# Altium footprint library SWARMUS_LIB.PcbLib: 114 footprints (part 7 of 8)
Each footprint in its own frame and in the unit in brackets; x right, y up, seen from the top. Pads: shape width x height; smd on the part's side, far side on the other; paste and mask are expansions set on the pad; w line width, h text height; cw(c..) or ccw(c..) is an arc to the next point about the centre after c.
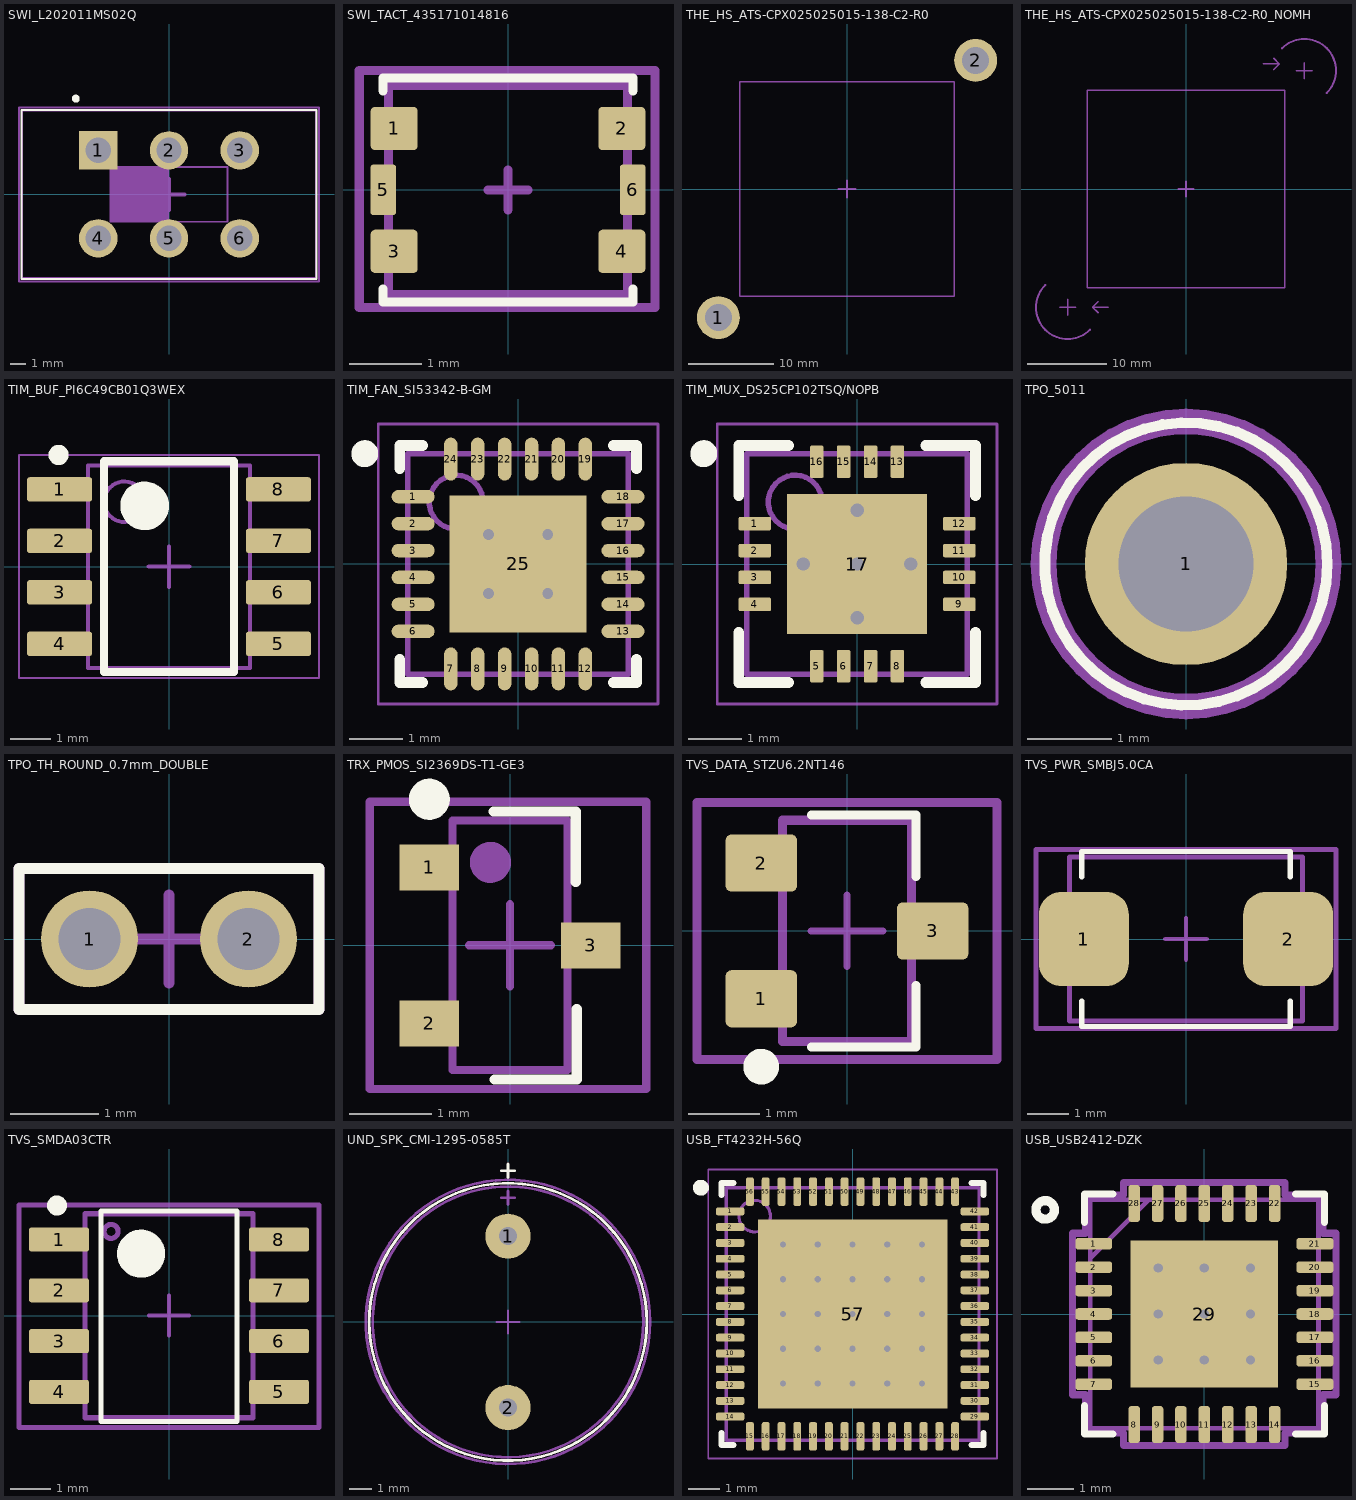
[diagram p6: the footprints below, top view; thin cyan lines are the x and y axes]

## SWI_L202011MS02Q [mm]
pads (6):
  rect 2.5x2.5 hole 1.65: 1(-4.6,2.86)
  round 2.5 hole 1.65: 2(0,2.86) 3(4.6,2.86) 4(-4.6,-2.86) 5(0,-2.86) 6(4.6,-2.86)
Top Overlay:
  circle w0.254: c-6.059,6.224 r0.127
  lines w0.127: -9.6,-5.5 -9.6,5.5 9.6,5.5 9.6,-5.5 -9.6,-5.5
Top Assembly Drawing:
  circle w0.127: c-5.486,-2.667 r0.265
  rectangle: -3.81,-1.778 0,1.778
  lines w0.127: -9.563,-5.448 -9.563,5.448 9.563,5.448 9.563,-5.448 -9.563,-5.448 ; -3.81,-1.778 -3.81,1.778 3.81,1.778 3.81,-1.778 -3.81,-1.778
Top Courtyard:
  lines w0.127: -9.75,-5.65 -9.75,5.65 9.75,5.65 9.75,-5.65 -9.75,-5.65
  lines w0.254: -1.016,0 1.016,0 ; 0,-1.016 0,1.016
3D body "L202011MS02Q.step": height 14.66, standoff -4.09, extent -9.563,-5.448 9.563,5.448

## SWI_TACT_435171014816 [mm]
pads (6):
  rrect20% 0.65x0.6 smd paste+0 mask+0.05: 1(-1.575,0.85) 2(1.575,0.85) 3(-1.575,-0.85) 4(1.575,-0.85)
  rrect20% 0.35x0.7 smd paste+0 mask+0.05: 5(-1.725,0) 6(1.725,0)
Top Overlay:
  lines w0.127: -1.727,-1.372 -1.727,-1.549 1.727,-1.549 1.727,-1.372 ; -1.727,1.372 -1.727,1.549 1.727,1.549 1.727,1.372
Top Assembly Drawing:
  lines w0.127: -1.651,-1.45 -1.651,1.45 ; -1.651,-1.448 1.65,-1.448 ; -1.651,1.448 1.649,1.448 ; 1.651,-1.45 1.651,1.45
Top Courtyard:
  lines w0.127: -0.275,0 0.275,0 ; 0,-0.275 0,0.275 ; -2.057,-1.626 2.032,-1.626 2.032,1.651 -2.057,1.651 -2.057,-1.626
3D body "WS-TASV SMT Tact Switch v4.step": height 1.4, standoff 0, extent -1.65,-1.45 1.65,1.45

## THE_HS_ATS-CPX025025015-138-C2-R0 [mm] "25x25x15mm Heatsink"
pads (2):
  round 5 hole 3.175 paste-7.62 mask+0.07: 1(-15,-15) 2(15,15)
Top Assembly Drawing:
  lines w0.2: -1,0 1,0 ; 0,-1 0,1 ; -12.5,-12.5 -12.5,12.5 12.5,12.5 12.5,-12.5 -12.5,-12.5
3D body "ATS-CPX-138-CX-R0_FUSED.STEP": height 15, standoff 0, extent -18.994,-18.994 18.994,18.994

## THE_HS_ATS-CPX025025015-138-C2-R0_NOMH [mm] "25x25x15mm Heatsink"
Top Assembly Drawing:
  lines w0.2: -16,-15 -14,-15 ; -15,-16 -15,-14 ; -11.127,-15.669 -11.834,-14.962 ; -11.127,-14.255 -11.834,-14.962 ; -9.834,-14.962 -11.834,-14.962 ; -1,0 1,0 ; 0,-1 0,1 ; 9.806,15.847 11.806,15.847 ; 11.099,15.14 11.806,15.847 ; 11.099,16.554 11.806,15.847 ; 14,15 16,15 ; 15,14 15,16 ; -12.5,-12.5 -12.5,12.5 12.5,12.5 12.5,-12.5 -12.5,-12.5
  lines w0.254: -17.828,-12.172 ccw(c-15,-15) -12.172,-17.828 ; 12.172,17.828 cw(c15,15) 17.828,12.172
  text "Grounded M3 Mounting hole" at -9.402,-16.935 h1
  text "Grounded M3 Mounting hole" at -3.563,13.741 h1
3D body "ATS-CPX-138-CX-R0_FUSED.STEP": height 16, standoff 1, extent -18.995,-18.994 18.994,18.995

## TIM_BUF_PI6C49CB01Q3WEX [mm] "SOIC-8"
height 1.75
pads (8):
  rrect20% 1.6x0.6 smd paste-0.025 mask+0.07: 1(-2.7,1.905) 2(-2.7,0.635) 3(-2.7,-0.635) 4(-2.7,-1.905) 5(2.7,-1.905) 6(2.7,-0.635) 7(2.7,0.635) 8(2.7,1.905)
Top Overlay:
  circle w0.25: c-2.725,2.755 r0.125
  circle w0.6: c-0.6,1.5 r0.3
  lines w0.2: -1.6,-2.6 1.6,-2.6 1.6,2.6 -1.6,2.6 -1.6,-2.6
Top Assembly Drawing:
  circle w0.1: c-1.1,1.6 r0.5
  lines w0.1: -2,-2.5 -2,2.5 2,2.5 2,-2.5 -2,-2.5
Top Courtyard:
  lines w0.05: -3.7,-2.75 -3.7,2.75 3.7,2.75 3.7,-2.75 -3.7,-2.75
  lines w0.1: -0.5,0 0.5,0 ; 0,-0.5 0,0.5
3D body "SOIC127P600X175-8N.step": height 1.75, standoff 0, extent -3,-2.5 3,2.5

## TIM_FAN_SI53342-B-GM [mm] "QFN24"
height 0.9
pads (25):
  oval 0.8x0.25 smd paste+0 mask+0.07: 1(-1.95,1.25) 2(-1.95,0.75) 3(-1.95,0.25) 4(-1.95,-0.25) 5(-1.95,-0.75) 6(-1.95,-1.25) 13(1.95,-1.25) 14(1.95,-0.75) 15(1.95,-0.25) 16(1.95,0.25) 17(1.95,0.75) 18(1.95,1.25)
  oval 0.25x0.8 smd paste+0 mask+0.07: 7(-1.25,-1.95) 8(-0.75,-1.95) 9(-0.25,-1.95) 10(0.25,-1.95) 11(0.75,-1.95) 12(1.25,-1.95) 19(1.25,1.95) 20(0.75,1.95) 21(0.25,1.95) 22(-0.25,1.95) 23(-0.75,1.95) 24(-1.25,1.95)
  rect 2.55x2.55 smd paste-2.55 mask+0.05: 25(0,0)
via 0.55,-0.55 diameter 0.5 hole 0.2
via -0.55,-0.55 diameter 0.5 hole 0.2
via 0.55,0.55 diameter 0.5 hole 0.2
via -0.55,0.55 diameter 0.5 hole 0.2
Top Overlay:
  circle w0.25: c-2.85,2.05 r0.125
  lines w0.2: -2.2,-1.775 -2.2,-2.2 -1.775,-2.2 ; -2.2,1.775 -2.2,2.2 -1.775,2.2 ; 1.775,-2.2 2.2,-2.2 2.2,-1.775 ; 1.775,2.2 2.2,2.2 2.2,1.775
Top Paste:
  rectangle: -1.25,0.15 -0.15,1.25
  rectangle: -1.25,-1.25 -0.15,-0.15
  rectangle: 0.15,-1.25 1.25,-0.15
  rectangle: 0.15,0.15 1.25,1.25
Top Assembly Drawing:
  circle w0.1: c-1.15,1.15 r0.5
  lines w0.1: -2.05,-2.05 2.05,-2.05 2.05,2.05 -2.05,2.05 -2.05,-2.05
Top Courtyard:
  lines w0.05: -2.6,-2.6 2.6,-2.6 2.6,2.6 -2.6,2.6 -2.6,-2.6
  lines w0.1: -0.5,0 0.5,0 ; 0,-0.5 0,0.5
3D body "QFN50P400X400X90_HS-25N.step": height 0.9, standoff 0, extent -2.051,-2.051 2.051,2.051

## TIM_MUX_DS25CP102TSQ/NOPB [mm] "WQFN-16"
height 0.8
pads (17):
  rrect20% 0.6x0.25 smd paste+0 mask+0.07: 1(-1.9,0.75) 2(-1.9,0.25) 3(-1.9,-0.25) 4(-1.9,-0.75) 9(1.9,-0.75) 10(1.9,-0.25) 11(1.9,0.25) 12(1.9,0.75)
  rrect20% 0.25x0.6 smd paste+0 mask+0.07: 5(-0.75,-1.9) 6(-0.25,-1.9) 7(0.25,-1.9) 8(0.75,-1.9) 13(0.75,1.9) 14(0.25,1.9) 15(-0.25,1.9) 16(-0.75,1.9)
  rect 2.6x2.6 smd paste-1.3 mask+0.07: 17(0,0)
via 0,0 diameter 0.5 hole 0.25
via -1,0 diameter 0.5 hole 0.25
via 0,1 diameter 0.5 hole 0.25
via 0,-1 diameter 0.5 hole 0.25
via 1,0 diameter 0.5 hole 0.25
Top Overlay:
  circle w0.25: c-2.85,2.05 r0.125
  lines w0.2: -2.2,-1.275 -2.2,-2.2 -1.275,-2.2 ; -2.2,1.275 -2.2,2.2 -1.275,2.2 ; 1.275,-2.2 2.2,-2.2 2.2,-1.275 ; 1.275,2.2 2.2,2.2 2.2,1.275
Top Paste:
  rectangle: 0.1,0.1 1.25,1.25
  rectangle: 0.1,-1.25 1.25,-0.1
  rectangle: -1.25,-1.25 -0.1,-0.1
  rectangle: -1.25,0.1 -0.1,1.25
Top Assembly Drawing:
  circle w0.1: c-1.15,1.15 r0.5
  lines w0.1: -2.05,-2.05 -2.05,2.05 2.05,2.05 2.05,-2.05 -2.05,-2.05
Top Courtyard:
  lines w0.05: -2.6,-2.6 -2.6,2.6 2.6,2.6 2.6,-2.6 -2.6,-2.6
  lines w0.1: -0.5,0 0.5,0 ; 0,-0.5 0,0.5
3D body "QFN50P400X400X80_HS-17N.step": height 0.8, standoff 0, extent -2.051,-2.051 2.051,2.051

## TPO_5011 [mm]
pads (1):
  round 2.4 hole 1.6: 1(0,0)
Top Overlay:
  circle w0.127: c0,0 r1.676
Top Assembly Drawing:
  circle w0.127: c0,0 r1.6
Top Courtyard:
  circle w0.127: c0,0 r1.779
3D body "keystone-PN5011.STEP": height 8.13, standoff -3.17, extent -1.587,-1.587 1.588,1.588

## TPO_TH_ROUND_0.7mm_DOUBLE [mm] "Double via TP"
pads (2):
  round 1.1 hole 0.7 mask+0.07: 1(-0.9,0) 2(0.9,0)
Top Overlay:
  lines w0.127: -1.7,-0.8 1.7,-0.8 1.7,0.8 -1.7,0.8 -1.7,-0.8
Top Courtyard:
  lines w0.127: -0.5,0 0.5,0 ; 0,-0.5 0,0.5 ; -1.7,-0.8 -1.7,0.8 1.7,0.8 1.7,-0.8 -1.7,-0.8

## TRX_PMOS_SI2369DS-T1-GE3 [mm]
height 1.12
pads (3):
  rect 0.724x0.559 smd paste-0.025 mask+0.07: 1(-0.984,0.95) 2(-0.984,-0.95) 3(0.984,0)
Top Overlay:
  circle w0.25: c-0.984,1.78 r0.125
  lines w0.127: -0.2,1.63 0.8,1.63 0.8,0.773 ; -0.188,-1.635 0.812,-1.635 0.812,-0.778
Top Assembly Drawing:
  circle w0.25: c-0.24,1.011 r0.125
  lines w0.1: -0.7,-1.52 -0.7,1.52 0.7,1.52 0.7,-1.52 -0.7,-1.52
Top Courtyard:
  lines w0.1: -0.5,0 0.5,0 ; 0,-0.5 0,0.5 ; -1.709,-1.75 -1.709,1.75 1.658,1.75 1.658,-1.75 -1.709,-1.75
3D body "SOT95P237X112-3N.step": height 1.12, standoff 0, extent -1.32,-1.52 1.32,1.52

## TVS_DATA_STZU6.2NT146 [mm] "SOT23, 3-Leads, Body 2.90x2.80mm, Pitch 0.95mm, IPC Medium Density"
height 1.3
pads (3):
  rrect20% 1x0.8 smd paste-0.05 mask+0.07: 1(-1.2,-0.95) 2(-1.2,0.95) 3(1.2,0)
Top Overlay:
  circle w0.25: c-1.2,-1.9 r0.125
  lines w0.127: -0.5,-1.625 0.968,-1.625 0.968,-0.764 ; -0.5,1.625 0.968,1.625 0.968,0.764
Top Assembly Drawing:
  lines w0.127: -0.9,-1.55 0.9,-1.55 0.9,1.55 -0.9,1.55 -0.9,-1.55
Top Courtyard:
  lines w0.1: -0.5,0 0.5,0 ; 0,-0.5 0,0.5
  lines w0.127: -2.1,-1.8 -2.1,1.8 2.1,1.8 2.1,-1.8 -2.1,-1.8
3D body "SOT95P280X130-3N.step": height 1.3, standoff 0, extent -1.5,-1.55 1.5,1.55

## TVS_PWR_SMBJ5.0CA [mm] "Molded Diode, 2-Leads, Body 4,40x3,62mm, IPC Medium Density"
height 2.61
pads (2):
  rrect50% 2.16x2.26 smd paste-0.025 mask+0.07: 1(-2.45,0) 2(2.45,0)
Top Overlay:
  lines w0.127: -2.5,-1.493 -2.5,-2.1 2.5,-2.1 2.5,-1.493 ; -2.5,1.493 -2.5,2.1 2.5,2.1 2.5,1.493
Top Assembly Drawing:
  lines w0.127: -2.795,-1.97 2.795,-1.97 2.795,1.97 -2.795,1.97 -2.795,-1.97
Top Courtyard:
  lines w0.1: -0.5,0 0.5,0 ; 0,-0.5 0,0.5
  lines w0.127: -3.6,-2.15 3.6,-2.15 3.6,2.15 -3.6,2.15 -3.6,-2.15
3D body "DIOM4436X26N.step": height 2.61, standoff 0, extent -2.595,-1.97 2.595,1.97

## TVS_SMDA03CTR [mm] "TVS - TVS DIODE 3.3V 7V - 8-SOIC"
height 1.8
pads (8):
  rrect20% 1.5x0.6 smd paste-0.025 mask+0.07: 1(-2.75,1.905) 2(-2.75,0.635) 3(-2.75,-0.635) 4(-2.75,-1.905) 5(2.75,-1.905) 6(2.75,-0.635) 7(2.75,0.635) 8(2.75,1.905)
Top Overlay:
  circle w0.25: c-2.8,2.755 r0.125
  circle w0.6: c-0.7,1.55 r0.3
  lines w0.127: -1.7,-2.642 1.7,-2.642 1.7,2.616 -1.7,2.616 -1.7,-2.642
Top Assembly Drawing:
  lines w0.127: -1.541,1.96 cw(c-1.448,2.108) -1.539,1.959 ; -2.1,-2.55 2.1,-2.55 2.1,2.55 -2.1,2.55 -2.1,-2.55
Top Courtyard:
  lines w0.1: -0.5,0 0.5,0 ; 0,-0.5 0,0.5
  lines w0.127: -3.75,-2.794 -3.75,2.769 3.75,2.769 3.75,-2.794 -3.75,-2.794
3D body "AMP_INSTR_AD623ARZ-RL.step": height 1.75, standoff 0, extent -3,-2.5 3,2.5

## UND_SPK_CMI-1295-0585T [mm]
pads (2):
  round 2 hole 0.8: 1(0,3.8) 2(0,-3.8)
Top Overlay:
  circle w0.127: c0,0 r6.15
  lines w0.127: -0.3,6.7 0.3,6.7 ; 0,6.4 0,7
Top Assembly Drawing:
  circle w0.127: c0,0 r6
  lines w0.127: -0.3,5.505 0.3,5.505 ; 0,5.205 0,5.805
Top Courtyard:
  circle w0.127: c0,0 r6.3
  lines w0.1: -0.5,0 0.5,0 ; 0,-0.5 0,0.5
3D body "CUI_DEVICES_CMI-1295-0585T.step": height 9.6, standoff -5.4, extent -6,-6 6,6

## USB_FT4232H-56Q [mm] "VQFN 56 pin"
height 0.9
pads (57):
  rrect50% 0.9x0.25 smd paste-0.05 mask+0.05: 1(-3.875,3.25) 2(-3.875,2.75) 3(-3.875,2.25) 4(-3.875,1.75) 5(-3.875,1.25) 6(-3.875,0.75) 7(-3.875,0.25) 8(-3.875,-0.25) 9(-3.875,-0.75) 10(-3.875,-1.25) 11(-3.875,-1.75) 12(-3.875,-2.25) 13(-3.875,-2.75) 14(-3.875,-3.25) 29(3.875,-3.25) 30(3.875,-2.75) 31(3.875,-2.25) 32(3.875,-1.75) 33(3.875,-1.25) 34(3.875,-0.75) 35(3.875,-0.25) 36(3.875,0.25) 37(3.875,0.75) 38(3.875,1.25) 39(3.875,1.75) 40(3.875,2.25) 41(3.875,2.75) 42(3.875,3.25)
  rrect50% 0.25x0.9 smd paste-0.05 mask+0.05: 15(-3.25,-3.875) 16(-2.75,-3.875) 17(-2.25,-3.875) 18(-1.75,-3.875) 19(-1.25,-3.875) 20(-0.75,-3.875) 21(-0.25,-3.875) 22(0.25,-3.875) 23(0.75,-3.875) 24(1.25,-3.875) 25(1.75,-3.875) 26(2.25,-3.875) 27(2.75,-3.875) 28(3.25,-3.875) 43(3.25,3.875) 44(2.75,3.875) 45(2.25,3.875) 46(1.75,3.875) 47(1.25,3.875) 48(0.75,3.875) 49(0.25,3.875) 50(-0.25,3.875) 51(-0.75,3.875) 52(-1.25,3.875) 53(-1.75,3.875) 54(-2.25,3.875) 55(-2.75,3.875) 56(-3.25,3.875)
  rect 6x6 smd paste-8 mask+0.05: 57(0,0)
via 2.2,-2.2 diameter 0.5 hole 0.2
via 1.1,-2.2 diameter 0.5 hole 0.2
via 0,-2.2 diameter 0.5 hole 0.2
via -1.1,-2.2 diameter 0.5 hole 0.2
via -2.2,-2.2 diameter 0.5 hole 0.2
via 2.2,-1.1 diameter 0.5 hole 0.2
via 1.1,-1.1 diameter 0.5 hole 0.2
via 0,-1.1 diameter 0.5 hole 0.2
via -1.1,-1.1 diameter 0.5 hole 0.2
via -2.2,-1.1 diameter 0.5 hole 0.2
via 2.2,0 diameter 0.5 hole 0.2
via 1.1,0 diameter 0.5 hole 0.2
via 0,0 diameter 0.5 hole 0.2
via -1.1,0 diameter 0.5 hole 0.2
via -2.2,0 diameter 0.5 hole 0.2
via 2.2,1.1 diameter 0.5 hole 0.2
via 1.1,1.1 diameter 0.5 hole 0.2
via 0,1.1 diameter 0.5 hole 0.2
via -1.1,1.1 diameter 0.5 hole 0.2
via -2.2,1.1 diameter 0.5 hole 0.2
via 2.2,2.2 diameter 0.5 hole 0.2
via 1.1,2.2 diameter 0.5 hole 0.2
via 0,2.2 diameter 0.5 hole 0.2
via -1.1,2.2 diameter 0.5 hole 0.2
via -2.2,2.2 diameter 0.5 hole 0.2
Top Overlay:
  circle w0.25: c-4.8,4 r0.125
  lines w0.2: -4.15,-3.775 -4.15,-4.15 -3.775,-4.15 ; -4.15,3.775 -4.15,4.15 -3.775,4.15 ; 3.775,-4.15 4.15,-4.15 4.15,-3.775 ; 3.775,4.15 4.15,4.15 4.15,3.775
Top Paste:
  rectangle: -1.725,-2.95 -0.725,-1.95
  rectangle: -1.725,-1.725 -0.725,-0.725
  rectangle: -1.725,1.95 -0.725,2.95
  rectangle: -1.725,0.725 -0.725,1.725
  rectangle: -1.725,-0.5 -0.725,0.5
  rectangle: -2.95,-2.95 -1.95,-1.95
  rectangle: -2.95,-1.725 -1.95,-0.725
  rectangle: -2.95,1.95 -1.95,2.95
  rectangle: -2.95,0.725 -1.95,1.725
  rectangle: -2.95,-0.5 -1.95,0.5
  rectangle: 1.95,-2.95 2.95,-1.95
  rectangle: 1.95,-1.725 2.95,-0.725
  rectangle: 1.95,1.95 2.95,2.95
  rectangle: 1.95,0.725 2.95,1.725
  rectangle: 1.95,-0.5 2.95,0.5
  rectangle: 0.725,-2.95 1.725,-1.95
  rectangle: 0.725,-1.725 1.725,-0.725
  rectangle: 0.725,1.95 1.725,2.95
  rectangle: 0.725,0.725 1.725,1.725
  rectangle: 0.725,-0.5 1.725,0.5
  rectangle: -0.5,-2.95 0.5,-1.95
  rectangle: -0.5,-1.725 0.5,-0.725
  rectangle: -0.5,1.95 0.5,2.95
  rectangle: -0.5,0.725 0.5,1.725
  rectangle: -0.5,-0.5 0.5,0.5
Top Assembly Drawing:
  circle w0.1: c-3.1,3.1 r0.5
  lines w0.1: -4,-4 4,-4 4,4 -4,4 -4,-4
Top Courtyard:
  lines w0.05: -4.575,-4.575 4.575,-4.575 4.575,4.575 -4.575,4.575 -4.575,-4.575
  lines w0.1: -0.5,0 0.5,0 ; 0,-0.5 0,0.5
3D body: height 0.9, standoff 0, extent -4,-4 4,4

## USB_USB2412-DZK [mm] "QFN 28(5x5)"
pads (29):
  rrect50% 0.8x0.25 smd paste-0.025 mask+0.05: 1(-2.4,1.524) 2(-2.4,1.016) 3(-2.4,0.508) 4(-2.4,0) 5(-2.4,-0.508) 6(-2.4,-1.016) 7(-2.4,-1.524) 15(2.4,-1.524) 16(2.4,-1.016) 17(2.4,-0.508) 18(2.4,0) 19(2.4,0.508) 20(2.4,1.016) 21(2.4,1.524)
  rrect50% 0.25x0.8 smd paste-0.025 mask+0.05: 8(-1.524,-2.4) 9(-1.016,-2.4) 10(-0.508,-2.4) 11(0,-2.4) 12(0.508,-2.4) 13(1.016,-2.4) 14(1.524,-2.4) 22(1.524,2.4) 23(1.016,2.4) 24(0.508,2.4) 25(0,2.4) 26(-0.508,2.4) 27(-1.016,2.4) 28(-1.524,2.4)
  rect 3.2x3.2 smd paste-1.587 mask+0.07: 29(0,0)
via 1,-1 diameter 0.5 hole 0.2
via 0,-1 diameter 0.5 hole 0.2
via -1,-1 diameter 0.5 hole 0.2
via 1,0 diameter 0.5 hole 0.2
via 0,0 diameter 0.5 hole 0.2
via -1,0 diameter 0.5 hole 0.2
via 1,1 diameter 0.5 hole 0.2
via 0,1 diameter 0.5 hole 0.2
via -1,1 diameter 0.5 hole 0.2
Top Overlay:
  circle w0.2: c-3.454,2.261 r0.2
  lines w0.152: -2.603,-1.984 -2.603,-2.603 -1.984,-2.603 ; -2.603,1.984 -2.603,2.603 -1.984,2.603 ; 1.984,-2.603 2.603,-2.603 2.603,-1.984 ; 1.984,2.603 2.603,2.603 2.603,1.984
Top Paste:
  rectangle: 0.65,-0.45 1.55,0.45
  rectangle: 0.65,-1.55 1.55,-0.65
  rectangle: 0.65,0.65 1.55,1.55
  rectangle: -0.45,-0.45 0.45,0.45
  rectangle: -0.45,-1.55 0.45,-0.65
  rectangle: -0.45,0.65 0.45,1.55
  rectangle: -1.55,-0.45 -0.65,0.45
  rectangle: -1.55,-1.55 -0.65,-0.65
  rectangle: -1.55,0.65 -0.65,1.55
Top Assembly Drawing:
  lines w0.1: -2.476,1.206 -1.206,2.476 ; -2.476,-2.476 -2.476,2.476 2.476,2.476 2.476,-2.476 -2.476,-2.476
Top Courtyard:
  lines w0.152: -2.857,-1.753 -2.578,-1.753 -2.578,-2.578 -1.753,-2.578 -1.753,-2.857 1.753,-2.857 1.753,-2.578 2.578,-2.578 2.578,-1.753 2.857,-1.753 2.857,1.753 2.578,1.753 2.578,2.578 1.753,2.578 1.753,2.857 -1.753,2.857 -1.753,2.578 -2.578,2.578 -2.578,1.753 -2.857,1.753 -2.857,-1.753
Bottom Courtyard:
  circle w0.127: c-1.181,-1.181 r0.318
  circle w0.127: c-1.181,-0.394 r0.318
  circle w0.127: c-1.181,0.394 r0.318
  circle w0.127: c-1.181,1.181 r0.318
  circle w0.127: c-0.394,-1.181 r0.318
  circle w0.127: c-0.394,-0.394 r0.318
  circle w0.127: c-0.394,0.394 r0.318
  circle w0.127: c-0.394,1.181 r0.318
  circle w0.127: c0.394,-1.181 r0.318
  circle w0.127: c0.394,-0.394 r0.318
  circle w0.127: c0.394,0.394 r0.318
  circle w0.127: c0.394,1.181 r0.318
  circle w0.127: c1.181,-1.181 r0.318
  circle w0.127: c1.181,-0.394 r0.318
  circle w0.127: c1.181,0.394 r0.318
  circle w0.127: c1.181,1.181 r0.318
3D body: height 0.25, standoff 0, extent 0,0 0.254,0.254
3D body "QFN28_5X5MC_MCH.step": height 1.4, standoff 0, extent -2.553,-2.553 2.553,2.553